# Altium footprint library DrPCB.PcbLib: 910 footprints (part 13 of 57)
Each footprint in its own frame and in the unit in brackets; x right, y up, seen from the top. Pads: shape width x height; smd on the part's side, far side on the other; paste and mask are expansions set on the pad; w line width, h text height; cw(c..) or ccw(c..) is an arc to the next point about the centre after c.
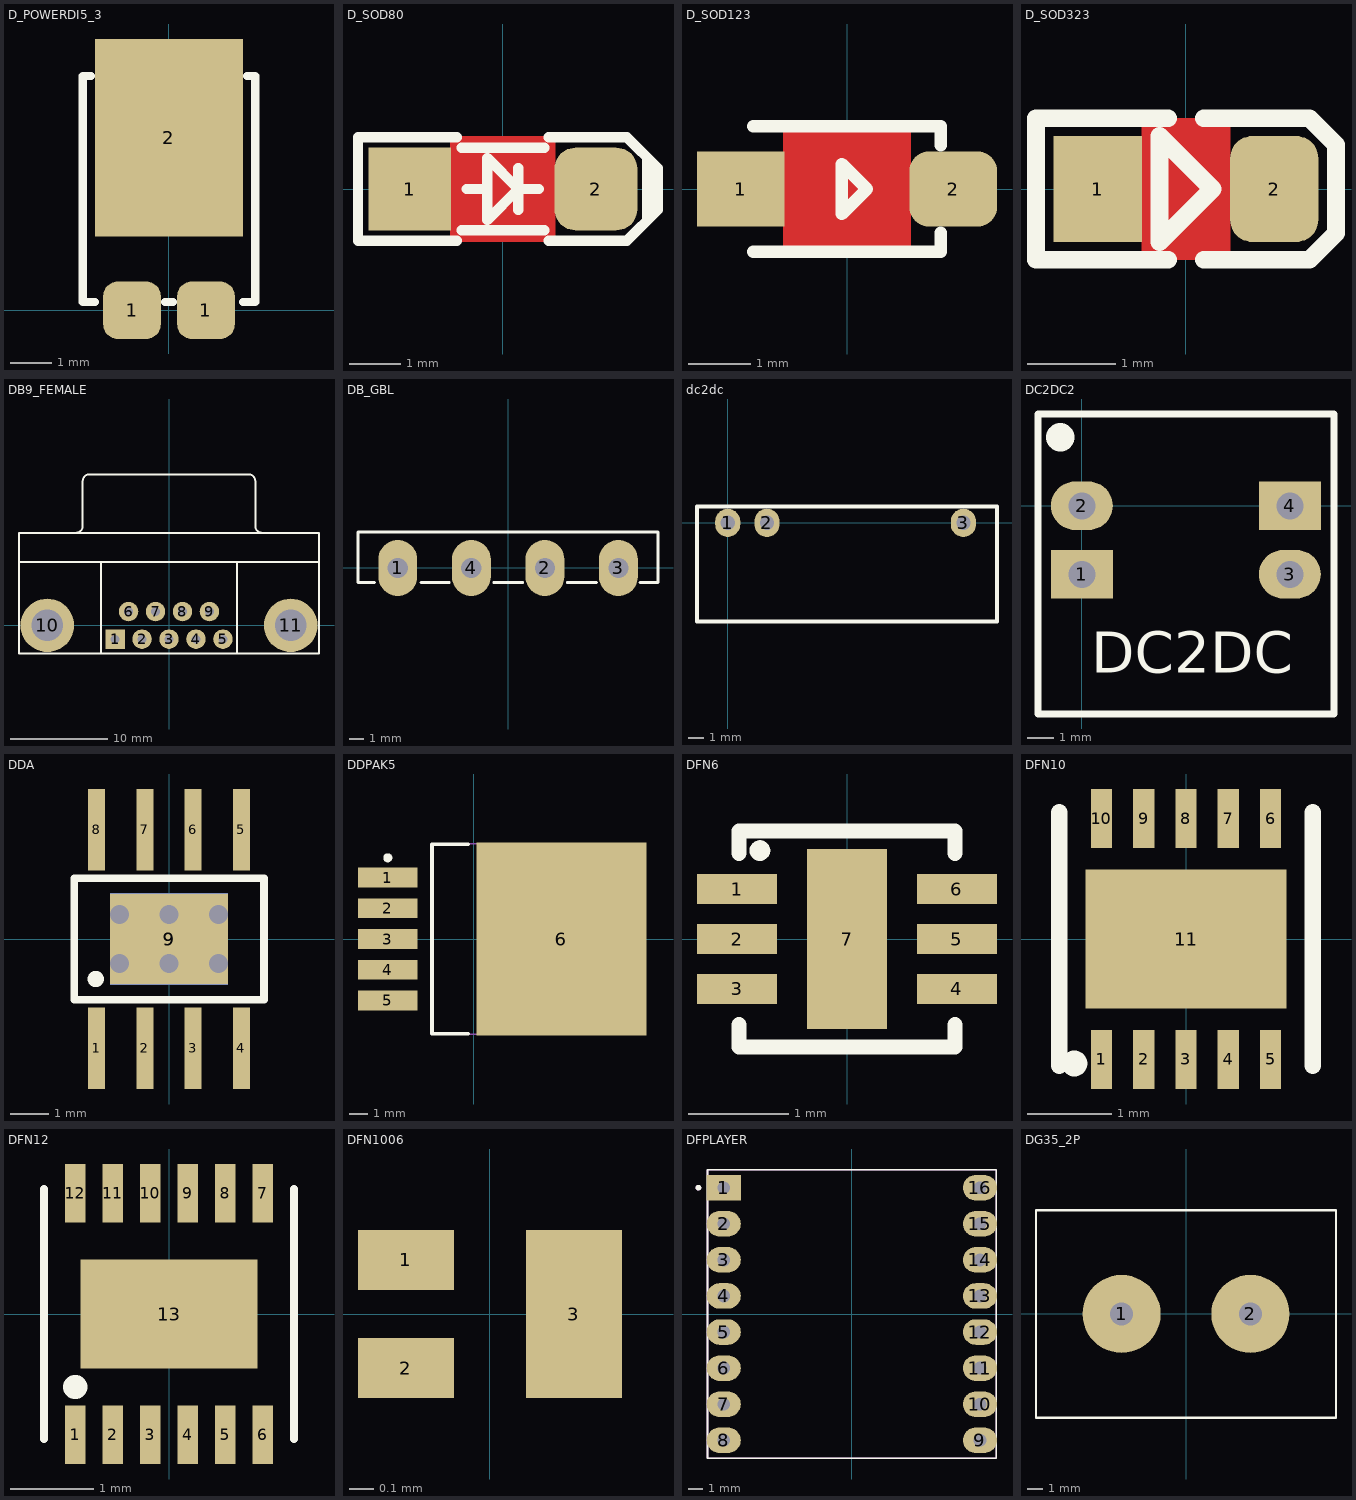
[diagram p12: the footprints below, top view; thin cyan lines are the x and y axes]

## D_POWERDI5_3 [mm] "POWERDI5, Body 5.5x4.0mm"
pads (3):
  rrect50% 1.4x1.4 smd: 1(-0.9,0) 1(0.9,0)
  rect 3.6x4.8 smd: 2(0,4.2)
Top Overlay:
  lines w0.2: -1.9,5.7 -2.1,5.7 -2.1,0.2 -1.8,0.2 ; -0.1,0.2 0.1,0.2 ; 1.8,0.2 2.1,0.2 2.1,5.7 1.9,5.7
3D body "User Library-PowerDI-5.STEP": height 1.17, standoff 0.02, extent -2.025,-0.3 2.025,6.3

## D_SOD80 [mm] "SOD-80 MINI-MELF 3.6X1.6mm, LL-34, LL4148"
height 1.6
pads (2):
  rect 1.6x1.6 smd paste-0.1: 1(-1.8,0)
  rrect50% 1.6x1.6 smd paste-0.1: 2(1.8,0)
Top Layer:
  pour cut-out: -1.016,1.016 1.016,1.016 1.016,-1.016 -1.016,-1.016
Top Overlay:
  region: 2.7,0.7 2.7,-0.7 3,-0.4 3,0.4
  lines w0.2: -0.889,-1 -2.8,-1 -2.8,1 -0.889,1 ; -0.8,-0.8 0.8,-0.8 ; -0.8,0.8 0.8,0.8 ; -0.7,0 -0.3,0 ; 0.3,-0.4 0.3,0.4 ; 0.7,0 0.3,0 ; 0.889,-1 2.4,-1 3,-0.4 3,0.4 2.4,1 0.889,1 ; 0.3,0 -0.3,0.6 -0.3,-0.6 0.3,0
3D body "User Library-MiniMelf-2.step": height 1.6, standoff 0, extent -1.85,-0.8 1.85,0.8

## D_SOD123 [mm] "SOD123, 1206D"
pads (2):
  rect 1.4x1.2 smd paste-0.1 mask+0.1: 1(-1.7,0)
  rrect50% 1.4x1.2 smd paste-0.1 mask+0.1: 2(1.7,0)
Top Layer:
  pour cut-out: -1.016,1.1 -1.016,-1.1 1.016,-1.1 1.016,1.1
Top Overlay:
  lines w0.2: -1.5,-1 1.5,-1 1.5,-0.7 ; -1.5,1 1.5,1 1.5,0.7 ; -0.081,-0.4 -0.081,0.4 0.319,0 -0.081,-0.4
3D body "User Library-POWERDI-123.STEP": height 1, standoff 0, extent -1.95,-0.965 1.95,0.965

## D_SOD323 [mm] "DIODE0805, SOD-323, SC-76, DL-35, 0805 similar size"
height 1.4
pads (2):
  rect 1x1.2 smd paste-2 mask+0.075: 1(-1,0)
  rrect50% 1x1.2 smd paste-2 mask+0.075: 2(1,0)
Top Layer:
  pour cut-out: -0.5,0.8 0.5,0.8 0.5,-0.8 -0.5,-0.8
Top Overlay:
  lines w0.2: -0.2,-0.8 -1.7,-0.8 -1.7,0.8 -0.2,0.8 ; 0.2,-0.8 1.4,-0.8 1.7,-0.5 1.7,0.5 1.4,0.8 0.2,0.8 ; -0.3,-0.6 -0.3,0.6 0.3,0 -0.3,-0.6
Top Paste:
  region: 0.9,0.5 0.82,0.5 0.673,0.439 0.561,0.327 0.5,0.18 0.5,0.1 0.5,-0.1 0.5,-0.18 0.561,-0.327 0.673,-0.439 0.82,-0.5 0.9,-0.5 1.15,-0.5 1.18,-0.5 1.235,-0.477 1.277,-0.435 1.3,-0.38 1.3,-0.35 1.3,0.35 1.3,0.38 1.277,0.435 1.235,0.477 1.18,0.5 1.15,0.5
  region: -0.9,0.5 -0.82,0.5 -0.673,0.439 -0.561,0.327 -0.5,0.18 -0.5,0.1 -0.5,-0.1 -0.5,-0.18 -0.561,-0.327 -0.673,-0.439 -0.82,-0.5 -0.9,-0.5 -1.15,-0.5 -1.18,-0.5 -1.235,-0.477 -1.277,-0.435 -1.3,-0.38 -1.3,-0.35 -1.3,0.35 -1.3,0.38 -1.277,0.435 -1.235,0.477 -1.18,0.5 -1.15,0.5
3D body "SOD323F.STEP": height 1, standoff 0, extent -1.25,-0.675 1.25,0.675

## DB9_FEMALE [mm]
pads (11):
  rect 2x2 hole 0.9: 1(-5.54,-1.42)
  round 2 hole 0.9: 2(-2.77,-1.42) 3(0,-1.42) 4(2.77,-1.42) 5(5.54,-1.42) 6(-4.155,1.42) 7(-1.385,1.42) 8(1.385,1.42) 9(4.155,1.42)
  round 5.5 hole 3.26: 10(-12.495,0) 11(12.495,0)
Top Overlay:
  lines w0.2: -15.4,6.5 15.4,6.5 ; -9.56,9.505 ccw(c-9.56,10.2) -8.865,10.2 -8.865,14.8 ; -8.86,14.805 cw(c-8.165,14.805) -8.165,15.5 8.165,15.5 cw(c8.165,14.805) 8.86,14.805 ; -7,-2.9 -7,6.5 ; 7,-2.9 7,6.5 ; 8.865,14.8 8.865,10.2 ccw(c9.56,10.2) 9.56,9.505 ; -15.4,-2.9 -15.4,9.5 15.4,9.5 15.4,-2.9 -15.4,-2.9
3D body "DB9 - 203-09SCKKBE.STEP": height 12.51, standoff -4.49, extent -15.405,-2.805 15.405,15.745

## DB_GBL [mm]
pads (4):
  oval 2.7x3.9 hole 1.4: 1(-7.65,0) 2(2.55,0) 3(7.65,0) 4(-2.55,0)
Top Overlay:
  lines w0.2: -9.262,-1 -10.406,-1 -10.406,2.5 10.394,2.5 10.394,-1 9.147,-1 ; -6.045,-1 -4.077,-1 ; -0.991,-1 1.016,-1 ; 4.102,-1 6.134,-1
3D body: height 14, standoff 0, extent -10.389,-0.991 10.389,2.502

## dc2dc [mm]
pads (3):
  oval 1.6x1.8 hole 0.9: 1(0,0) 2(2.5,0) 3(15,0)
Top Overlay:
  lines w0.254: -1.956,-6.27 17.143,-6.27 17.143,1.024 -1.956,1.024 -1.956,-6.27

## DC2DC2 [mm]
pads (4):
  rect 2.3x1.8 hole 1: 1(-0.002,-2.54) 4(7.711,0)
  oval 2.3x1.8 hole 1: 2(-0.002,0) 3(7.711,-2.54)
Top Overlay:
  circle w1: c-0.801,2.54 r0.026
  lines w0.254: -1.626,-7.722 9.347,-7.722 9.347,3.404 -1.626,3.404 -1.626,-7.722
  text "DC2DC" at 0.356,-6.198 h1.52

## DDA [mm]
pads (10):
  rect 0.45x2.15 smd: 1(-1.905,-2.875) 2(-0.635,-2.875) 3(0.635,-2.875) 4(1.905,-2.875) 5(1.905,2.875) 6(0.635,2.875) 7(-0.635,2.875) 8(-1.905,2.875)
  rect 3.1x2.4 smd: 9(0,0)
  rect 3.1x2.4 smd far side: 9(0,0)
via -1.3,-0.65 diameter 0.5 hole 0.5
via -1.3,0.65 diameter 0.5 hole 0.5
via 0,0.65 diameter 0.5 hole 0.5
via 0,-0.65 diameter 0.5 hole 0.5
via 1.3,0.65 diameter 0.5 hole 0.5
via 1.3,-0.65 diameter 0.5 hole 0.5
Top Overlay:
  circle w0.254: c-1.93,-1.054 r0.089
  lines w0.2: -2.498,-1.6 -2.498,1.6 2.502,1.6 2.502,-1.6 -2.498,-1.6

## DDPAK5 [mm]
pads (6):
  rect 3.3x1.1 smd: 1(-4.775,3.4) 2(-4.775,1.7) 3(-4.775,0) 4(-4.775,-1.7) 5(-4.775,-3.4)
  rect 9.4x10.7 smd: 6(4.851,0)
Top Overlay:
  circle w0.25: c-4.775,4.5 r0.125
  lines w0.2: -0.325,-5.25 -2.325,-5.25 -2.325,5.25 -0.325,5.25
Mechanical 13:
  lines w0.1: -2.325,-5.275 7.075,-5.275 7.075,5.275 -2.325,5.275 -2.325,-5.275
3D body "TO170P1394X457-6__NA__LINEAR TECHNOLOGY__DDPAK-5_Q-L__NA--3DModel-Eagle-2523.STEP": height 4.57, standoff -0.05, extent -4.948,-4.699 8.326,4.699

## DFN6 [mm]
pads (7):
  rect 0.8x0.3 smd paste-0.07: 1(-1.1,0.5) 2(-1.1,0) 3(-1.1,-0.5) 4(1.1,-0.5) 5(1.1,0) 6(1.1,0.5)
  rect 0.8x1.8 smd paste-0.15: 7(0,0)
Top Overlay:
  circle w0.1: c-0.871,0.884 r0.054
  lines w0.152: -1.079,-0.858 -1.079,-1.079 1.079,-1.079 1.079,-0.858 ; -1.079,0.858 -1.079,1.079 1.079,1.079 1.079,0.858
3D body "step_temp.STEP": height 0.8, standoff 0, extent -1,-1 1,1

## DFN10 [mm]
pads (11):
  rect 0.25x0.7 smd: 1(-1,-1.425) 2(-0.5,-1.425) 3(0,-1.425) 4(0.5,-1.425) 5(1,-1.425) 6(1,1.425) 7(0.5,1.425) 8(0,1.425) 9(-0.5,1.425) 10(-1,1.425)
  rect 2.38x1.65 smd: 11(0,0)
Top Overlay:
  circle w0.254: c-1.321,-1.473 r0.025
  lines w0.2: -1.5,-1.5 -1.5,1.5 ; 1.5,-1.5 1.5,1.5
3D body "User Library-DFN-10-1.STEP": height 1.07, standoff 0, extent -1.5,-1.5 1.5,1.5

## DFN12 [mm]
pads (13):
  rect 0.25x0.7 smd mask+0.05: 1(-1.125,-1.45) 2(-0.675,-1.45) 3(-0.225,-1.45) 4(0.225,-1.45) 5(0.675,-1.45) 6(1.125,-1.45) 7(1.125,1.45) 8(0.675,1.45) 9(0.225,1.45) 10(-0.225,1.45) 11(-0.675,1.45) 12(-1.125,1.45)
  rect 2.12x1.31 smd: 13(0,0)
Top Overlay:
  circle w0.254: c-1.125,-0.876 r0.018
  lines w0.1: -1.5,-1.5 -1.5,1.5 ; 1.5,-1.5 1.5,1.5
3D body "User Library-DFN12(3x3).step": height 0.77, standoff 0.01, extent -1.5,-1.501 1.5,1.501

## DFN1006 [mm]
pads (3):
  rect 0.4x0.25 smd mask+0.05: 1(-0.35,0.225) 2(-0.35,-0.225)
  rect 0.4x0.7 smd mask+0.05: 3(0.35,0)
3D body "Part1.STEP": height 0.41, standoff 0.01, extent -0.5,-0.3 0.5,0.3

## DFPLAYER [mm]
pads (16):
  rect 2.4x1.8 hole 0.9: 1(-9.017,8.89)
  oval 2.4x1.8 hole 0.9: 2(-9.017,6.35) 3(-9.017,3.81) 4(-9.017,1.27) 5(-9.017,-1.27) 6(-9.017,-3.81) 7(-9.017,-6.35) 8(-9.017,-8.89) 9(9.017,-8.89) 10(9.017,-6.35) 11(9.017,-3.81) 12(9.017,-1.27) 13(9.017,1.27) 14(9.017,3.81) 15(9.017,6.35) 16(9.017,8.89)
Top Overlay:
  circle w0.2: c-10.8,8.89 r0.1
  lines w0.127: -10.16,-10.16 10.16,-10.16 10.16,10.16 -10.16,10.16 -10.16,-10.16
Mechanical 13:
  circle w0.2: c-10.8,8.89 r0.1
  lines w0.127: -10.16,-10.16 -10.16,10.16 10.16,10.16 10.16,-10.16 -10.16,-10.16
3D body "DFR0299--3DModel-STEP-56544.STEP": height 15.25, standoff 3.5, extent -10.16,-10.16 10.16,10.16
3D body "female_header_a-bl254-eg-g02d.stp": height 8.5, standoff -3.2, extent 7.767,4.965 10.267,10.295
3D body "female_header_a-bl254-eg-g03d.stp": height 8.5, standoff -3.2, extent 7.767,-10.275 10.267,-2.405
3D body "female_header_a-bl254-eg-g03d.stp": height 8.5, standoff -3.2, extent 7.767,-2.655 10.267,5.215
3D body "female_header_a-bl254-eg-g02d.stp": height 8.5, standoff -3.2, extent -10.267,4.952 -7.767,10.282
3D body "female_header_a-bl254-eg-g03d.stp": height 8.5, standoff -3.2, extent -10.267,-10.288 -7.767,-2.418
3D body "female_header_a-bl254-eg-g03d.stp": height 8.5, standoff -3.2, extent -10.267,-2.668 -7.767,5.202

## DG35_2P [mm]
pads (2):
  round 5 hole 1.45: 1(-4.125,0) 2(4.125,0)
Top Overlay:
  lines w0.15: -9.601,-6.65 9.6,-6.65 9.6,6.642 -9.6,6.642 -9.6,-6.65
3D body "KF35.STEP": height 14.81, standoff -3.99, extent -9.156,-6.9 9.156,6.9